# Altium integrated library Self made library.IntLib: 370 symbols (part 3 of 3) (continued)
## TLV70025
designator U?  Manufacturer Part Number 1: TLV70025DDCR
MANUFACTURER: Texas Instruments; MANUFACTURER_PART_NUMBER: TLV70025QDDCRQ1; UNIT_PRICE: 0.62; Description 1: Régulateurs de tension LDO 200mA Low IQ Low Dropout Reg; Tension d'entrée max.: 5.5 V; Nombre de sorties: 1 Output; Courant de sortie: 200 mA; Type de sortie: Fixed; Tension de sortie: 2.5 V; Package/Boîte: SOT-23-5; Conditionnement: Reel; Tension de décrochage maximale: 175 mV at 200 mA; Style de montage: SMD/SMT; Tolérance de la tension de sortie: 2 %; Régulation de la ligne: 1 mV; Température de fonctionnement max.: + 125 C; Dissipation de puissance max.: 500 mW; Température de fonctionnement min.: - 40 C; Catégorie du produit: Regulators - Low Dropout (LDO); Quantité standard du lot: 3000; SUPPLIER: Mouser; SUPPLIER_PART_NUMBER: 595-TLV70025QDDCRQ1; Supplier 1: Mouser; Supplier Part Number 1: 595-TLV70025DDCR; Manufacturer 1: Texas Instruments; RoHS: RoHS Compliant; Category: Régulateurs de tension LDO; Stock 1: 1832; Pricing 1: 1=0.532, 10=0.405, 100=0.213, 1000=0.191, 3000=0.163, 9000=0.151, 24000=0.145 (CHF); Série: TLV70025; Marque: Texas Instruments; Précision de la régulation de la tension: 2 %; Régulation de la charge: 1 mV; Fabricant: Texas Instruments; RoHS - Mouser: Y; Minimum Order Quantity: 1; Reeling: True; ComponentLink1URL: http://www.mouser.com/ds/2/405/tlv700-558265.pdf; ComponentLink1Description: http://www.mouser.com/ds/2/405/tlv700-558265.pdf
footprint SOT-23-5
pins: 1 VIN, 2 GND, 3 EN, 4 NC, 5 VOUT

## TLV70028
designator U?  Manufacturer Part Number 1: TLV70028DDCR
MANUFACTURER: Texas Instruments; MANUFACTURER_PART_NUMBER: TLV70025QDDCRQ1; UNIT_PRICE: 0.62; Description 1: Régulateurs de tension LDO 200mA Low IQ LDO Reg for Portables; Tension d'entrée max.: 5.5 V; Nombre de sorties: 1 Output; Courant de sortie: 200 mA; Type de sortie: Fixed; Tension de sortie: 2.8 V; Package/Boîte: SOT-23-5; Conditionnement: Reel; Tension de décrochage maximale: 175 mV at 200 mA; Style de montage: SMD/SMT; Tolérance de la tension de sortie: 2 %; Kit de développement: TLV70028EVM-463; Tension d'entrée MIN: + 2 V; Régulation de la ligne: 1 mV; Température de fonctionnement max.: + 125 C; Dissipation de puissance max.: 0.5 W; Température de fonctionnement min.: - 40 C; Catégorie du produit: Regulators - Low Dropout (LDO); Quantité standard du lot: 3000; SUPPLIER: Mouser; SUPPLIER_PART_NUMBER: 595-TLV70025QDDCRQ1; Supplier 1: Mouser; Supplier Part Number 1: 595-TLV70028DDCR; Manufacturer 1: Texas Instruments; RoHS: RoHS Compliant; Category: Régulateurs de tension LDO; Stock 1: 2338; Pricing 1: 1=0.532, 10=0.405, 100=0.213, 1000=0.191, 3000=0.163, 9000=0.151, 24000=0.145 (CHF); Série: TLV70028; Marque: Texas Instruments; Précision de la régulation de la tension: 2 %; Régulation de la charge: 1 mV; Fabricant: Texas Instruments; RoHS - Mouser: Y; Minimum Order Quantity: 1; Reeling: True; ComponentLink1URL: http://www.mouser.com/ds/2/405/tlv700-558265.pdf; ComponentLink1Description: http://www.mouser.com/ds/2/405/tlv700-558265.pdf
footprint SOT-23-5
pins: 1 VIN, 2 GND, 3 EN, 4 NC, 5 VOUT

## TP
designator ?, comment Test point
footprint TP
pins: P$1 1

## TPS2041SO
designator U?, comment Manufacturer Part Number 1: TPS2041BDBVR  (hidden comment: TPS2041B   CURRENT-LIMITED, POWER-DISTRIBUTION SWITCHES)
MANUFACTURER: Texas Instruments; UNIT_PRICE: 1.53; Description 1: CI commutateurs USB Sgl Ch Crnt-Ltd Pwr Dist Sw; Plage de températures de fonctionnement: - 40 C to + 85 C; Package/Boîte: SOT-23-5; Conditionnement: Reel; Style de montage: SMD/SMT; Température de fonctionnement max.: + 85 C; Température de fonctionnement min.: - 40 C; Nombre d'interrupteurs: Single; Catégorie du produit: Hot Swap and Power Distribution; Quantité standard du lot: 3000; Tension d’alimentation - Max.: 5.5 V; Tension d’alimentation - Min.: 2.7 V; MANUFACTURER_PART_NUMBER: TPS2041BDBVR; SUPPLIER: mouser; SUPPLIER_PART_NUMBER: 595-TPS2041BDBVR; Supplier 1: Mouser; Supplier Part Number 1: 595-TPS2041BDBVR; Manufacturer 1: Texas Instruments; RoHS: RoHS Compliant; Category: CI commutateurs USB; Stock 1: 8341; Pricing 1: 1=1.41, 10=1.13, 100=0.868, 500=0.671, 1000=0.605, 3000=0.537, 9000=0.520 (CHF); Série: TPS2041B; Marque: Texas Instruments; Fabricant: Texas Instruments; RoHS - Mouser: Y; Minimum Order Quantity: 1; Reeling: True; ComponentLink1URL: http://www.mouser.com/ds/2/405/tps2041b-407888.pdf; ComponentLink1Description: http://www.mouser.com/ds/2/405/tps2041b-407888.pdf
footprint R-PDSO-G5
pins: 1 OUT, 2 GND, 3 OC, 4 EN, 5 IN

## TPS53318
designator U?, comment Régulateurs de tension - Régulateurs de commutation Hi Eff 8A SD Reg  Manufacturer Part Number 1: TPS53318DQPR
MANUFACTURER: Texas Instruments; UNIT_PRICE: 6.6; Tension d'entrée: 1.5 V to 22 V; Tension d'entrée max.: 22 V; Nombre de sorties: 1 Output; Plage de températures de fonctionnement: - 40 C to + 85 C; Tension de sortie: 0.6 V to 5.5 V; Package/Boîte: LSON-CLIP-22; Conditionnement: Reel; Série: TPS53318; Style de montage: SMD/SMT; Fréquence de commutation: 250 kHz to 1 MHz; Topologie: Buck; Tension d'entrée MIN: 1.5 V; Température de fonctionnement max.: + 85 C; Température de fonctionnement min.: - 40 C; Catégorie du produit: Regulators - Non-Isolated Switching DC/DC; Quantité standard du lot: 2500; MANUFACTURER_PART_NUMBER: TPS53318DQPR; SUPPLIER: Mouser; SUPPLIER_PART_NUMBER: 595-TPS53318DQPR; Supplier 1: Mouser; Supplier Part Number 1: 595-TPS53318DQPR; Manufacturer 1: Texas Instruments; RoHS: RoHS Compliant; Description 1: Régulateurs de tension - Régulateurs de commutation Hi Eff 8A SD Reg; Category: Régulateurs de tension - Régulateurs de commutation; Stock 1: 9077; Pricing 1: 1=6.52, 10=5.86, 25=5.50, 50=5.34, 100=4.82, 250=4.43, 500=4.04, 750=3.73, 1000=3.36, 2500=3.36 (CHF); Courant de sortie: 8 A; Type: Voltage Converter; Marque: Texas Instruments; Fabricant: Texas Instruments; RoHS - Mouser: Y; Minimum Order Quantity: 1; Reeling: True; ComponentLink1URL: http://www.mouser.com/ds/2/405/tps53318-556625.pdf; ComponentLink1Description: http://www.mouser.com/ds/2/405/tps53318-556625.pdf
footprint R-PSON-N22
pins: 1 VFB, 2 EN, 3 PGOOD, 4 VBST, 5 ROVP, 6 LL, 7 LL@1, 8 LL@2, 9 LL@3, 10 LL@4, 11 LL@5, 12 VIN, 13 VIN@1, 14 VIN@2, 15 VIN@3, 16 VIN@4, 17 VIN@5, 18 VREG, 19 VDD, 20 MODE, 21 TRIP, 22 RF, GND

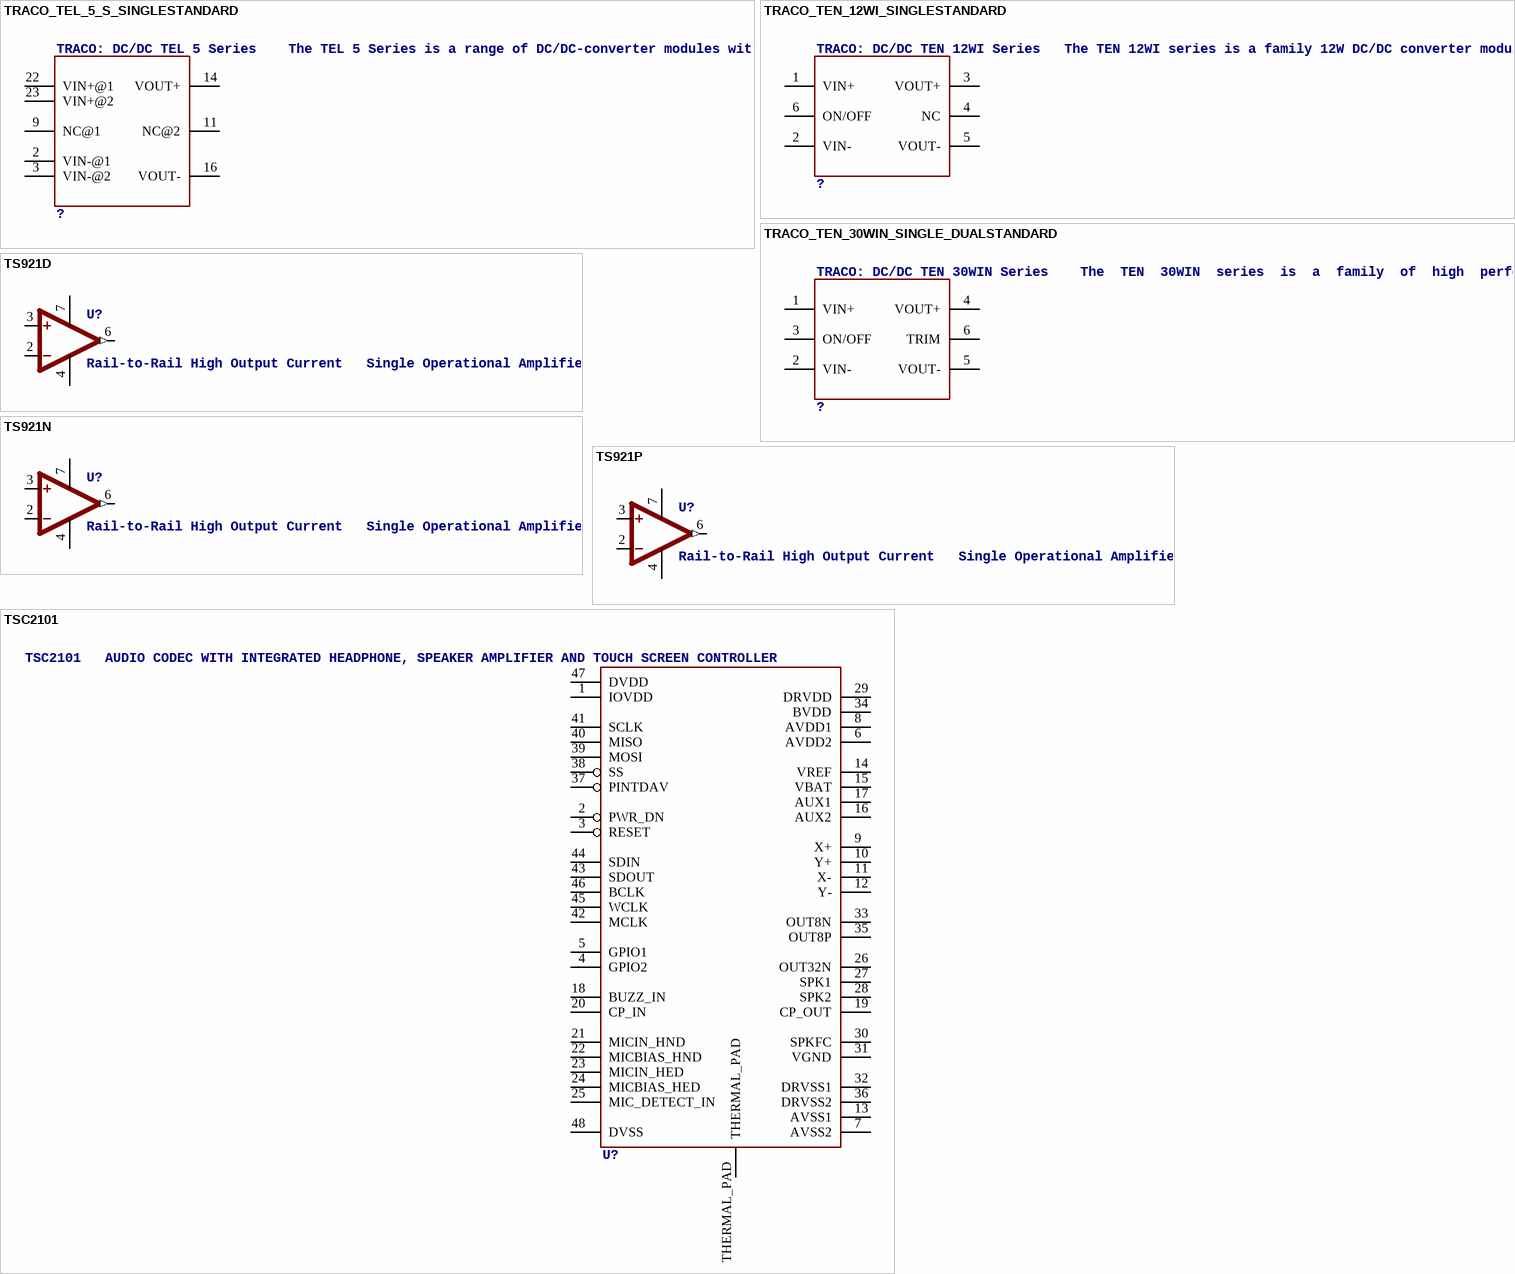
[diagram p18: symbols TRACO_TEL_5_S_SINGLESTANDARD to TSC2101]

## TRACO_TEL_5_S_SINGLESTANDARD
designator ?, comment TRACO: DC/DC TEL 5 Series    The TEL 5 Series is a range of DC/DC-converter modules with wide input range of 2:1. State of the art SMD-technology guarantees a product with very high reli- ability and excellent cost /performance ratio. High efficiency allows an operating temperature range of
footprint TEL_5_S
pins: 2 VIN-@1, 3 VIN-@2, 9 NC@1, 11 NC@2, 14 VOUT+, 16 VOUT-, 22 VIN+@1, 23 VIN+@2

## TRACO_TEN_12WI_SINGLESTANDARD
designator ?, comment TRACO: DC/DC TEN 12WI Series   The TEN 12WI series is a family 12W DC/DC converter modules.
footprint TEN12WI
pins: 1 VIN+, 2 VIN-, 3 VOUT+, 4 NC, 5 VOUT-, 6 ON/OFF

## TRACO_TEN_30WIN_SINGLE_DUALSTANDARD
designator ?, comment TRACO: DC/DC TEN 30WIN Series    The  TEN  30WIN  series  is  a  family  of  high  performance  30W  dc-dc  converter modules featuring ultra wide 4:1 input voltage ranges in a compact low profile case with industry-standard footprint. Standard features include remote On/Off, output voltage trimming, over voltage protection, under voltage lockout, over temperature and short circuit protection. Typical  applications  for  these  products  are  battery  operated  equipment  and distributed power architectures in communication and industrial electronics, every- where where isolated, tightly regulated voltages are required and space is limited on the PCB.
footprint TEN30WIN_SINGLE_DUAL
pins: 1 VIN+, 2 VIN-, 3 ON/OFF, 4 VOUT+, 5 VOUT-, 6 TRIM

## TS921D
designator U?, comment Rail-to-Rail High Output Current   Single Operational Amplifier
footprint SO-8
pins: 2 -IN, 3 +IN, 4 V- (power), 6 OUT (out), 7 V+ (power)

## TS921N
designator U?, comment Rail-to-Rail High Output Current   Single Operational Amplifier
footprint DIP8
pins: 2 -IN, 3 +IN, 4 V- (power), 6 OUT (out), 7 V+ (power)

## TS921P
designator U?, comment Rail-to-Rail High Output Current   Single Operational Amplifier
footprint TSSOP8
pins: 2 -IN, 3 +IN, 4 V- (power), 6 OUT (out), 7 V+ (power)

## TSC2101
designator U?, comment TSC2101   AUDIO CODEC WITH INTEGRATED HEADPHONE, SPEAKER AMPLIFIER AND TOUCH SCREEN CONTROLLER
MANUFACTURER: Texas Instruments; MANUFACTURER_PART_NUMBER: TSC2101IRGZ; UNIT_PRICE: 9.93; SUPPLIER: mouser; SUPPLIER_PART_NUMBER: 595-TSC2101IRGZ
footprint S-PVQFN-N48_LARGERPINS
pins: 1 IOVDD, 2 PWR_DN, 3 RESET, 4 GPIO2, 5 GPIO1, 6 AVDD2, 7 AVSS2, 8 AVDD1, 9 X+, 10 Y+, 11 X-, 12 Y-, 13 AVSS1, 14 VREF, 15 VBAT, 16 AUX2, 17 AUX1, 18 BUZZ_IN, 19 CP_OUT, 20 CP_IN, 21 MICIN_HND, 22 MICBIAS_HND, 23 MICIN_HED, 24 MICBIAS_HED, 25 MIC_DETECT_IN, 26 OUT32N, 27 SPK1, 28 SPK2, 29 DRVDD, 30 SPKFC, 31 VGND, 32 DRVSS1, 33 OUT8N, 34 BVDD, 35 OUT8P, 36 DRVSS2, 37 PINTDAV, 38 SS, 39 MOSI, 40 MISO, 41 SCLK, 42 MCLK, 43 SDOUT, 44 SDIN, 45 WCLK, 46 BCLK, 47 DVDD, 48 DVSS, THERMAL_PAD

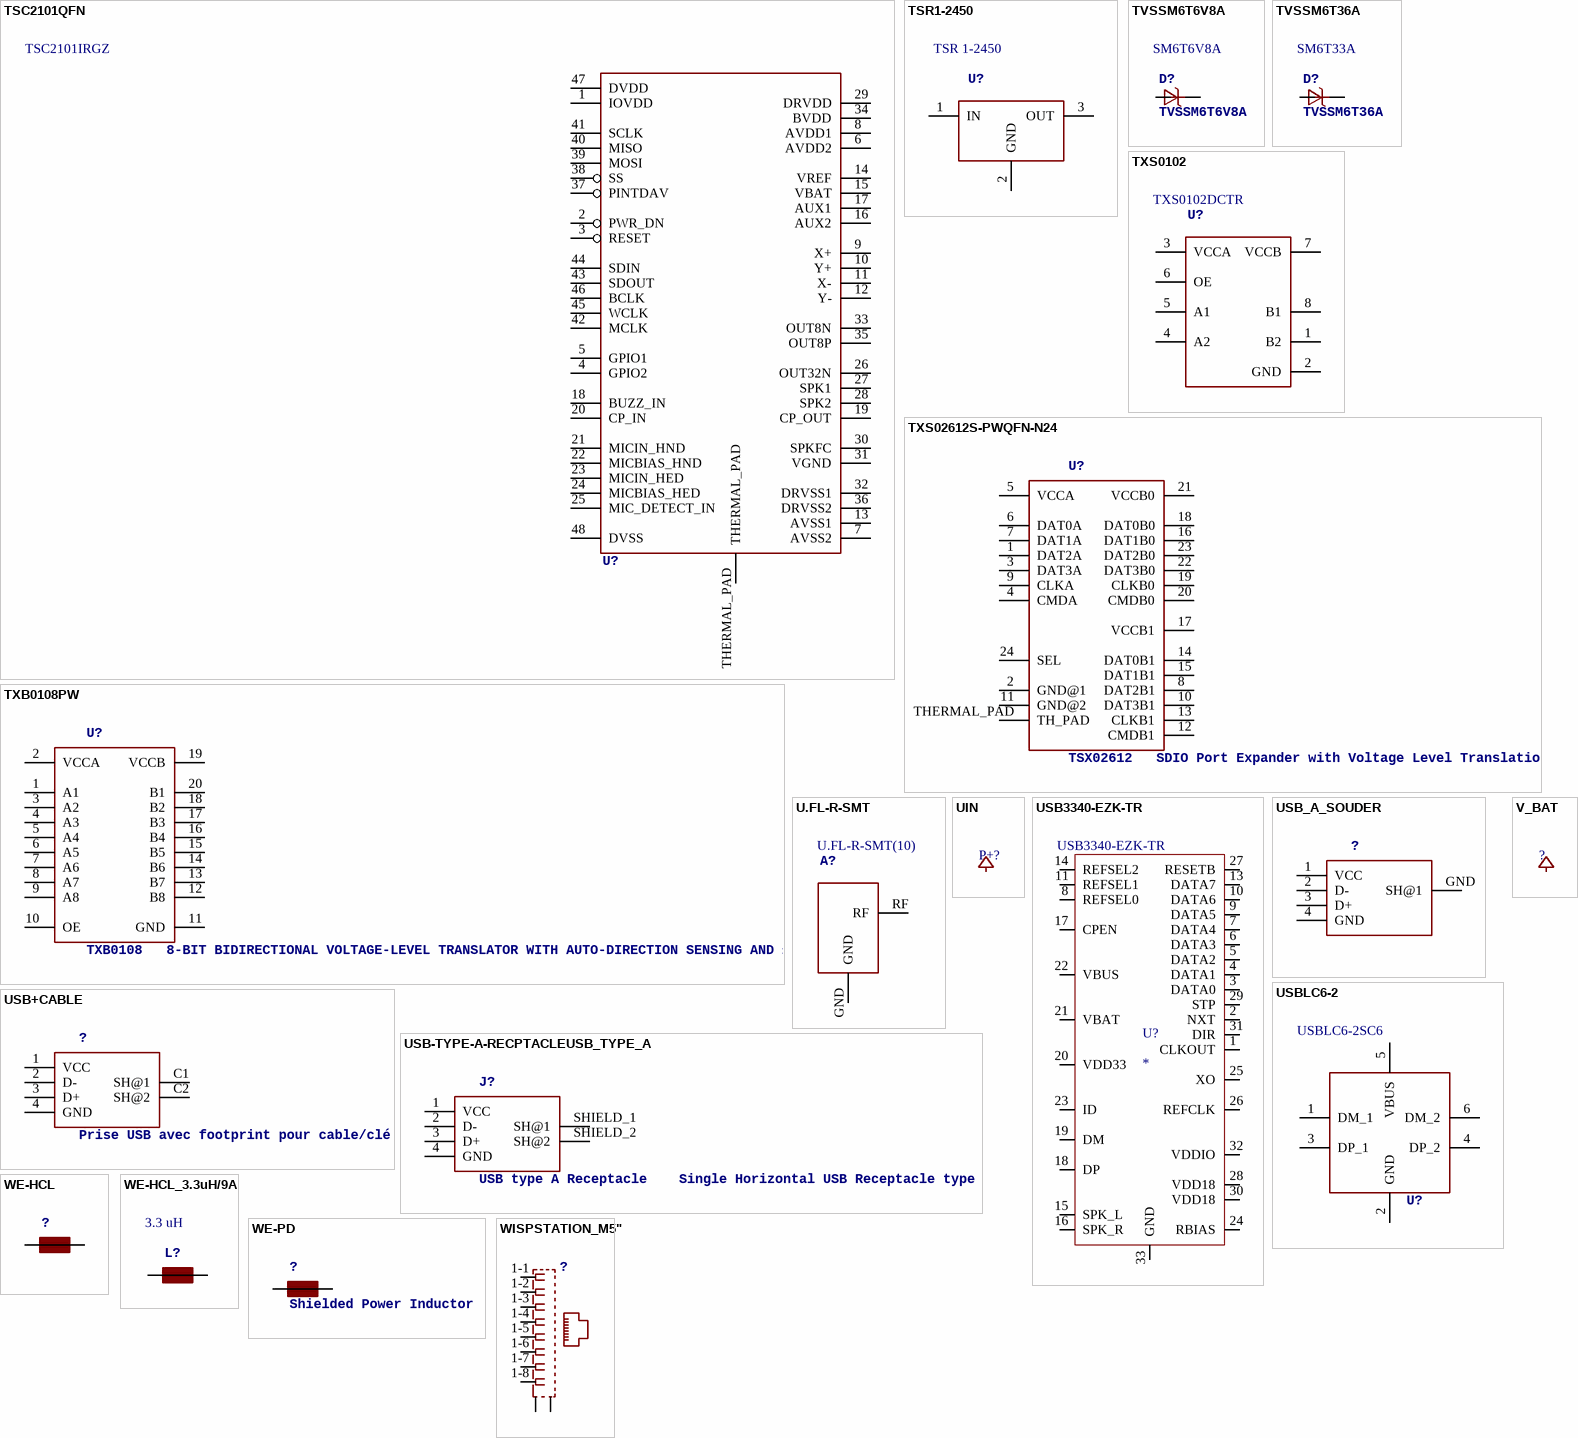
[diagram p19: symbols TSC2101QFN to WISPSTATION_M5"]

## TSC2101QFN
designator U?, comment Manufacturer Part Number 1: TSC2101IRGZ  (hidden comment: TSC2101   AUDIO CODEC WITH INTEGRATED HEADPHONE, SPEAKER AMPLIFIER AND TOUCH SCREEN CONTROLLER)
MANUFACTURER: Texas Instruments; UNIT_PRICE: 9.04; Description 1: Contrôleurs d'écran tactile Prog 4-Wire w/6 Audio Inputs; Débit de données: 125 kS/s, 48 kS/s; Type d'entrée: 1 TSC; Température de fonctionnement: - 40 C to + 85 C; Package/Boîte: VQFN-48; Conditionnement: Tube; Résolution: 8 bit, 10 bit, 12 bit; Alimentation en courant: 82 uA; Tension d'alimentation: 3 V to 3.6 V; Type d'interface: Serial, 3-Wire, 4-Wire, SPI; Style de montage: SMD/SMT; Kit de développement: TSC2101EVM; Température de fonctionnement max.: + 85 C; Température de fonctionnement min.: - 40 C; Nombre d'entrées de CAD: 5 Input; Nombre de sorties de CNA: 5 Output; Catégorie du produit: Touch Screen Controllers; Quantité standard du lot: 52; Tension d’alimentation - Max.: 3.6 V; Tension d’alimentation - Min.: 3 V; MANUFACTURER_PART_NUMBER: TSC2101IRGZ; SUPPLIER: DigiKey; SUPPLIER_PART_NUMBER: 296-17512-ND; Supplier 1: Mouser; Supplier Part Number 1: 595-TSC2101IRGZ; Manufacturer 1: Texas Instruments; RoHS: RoHS Compliant; Category: Contrôleurs d'écran tactile; Stock 1: 4; Pricing 1: 1=10.11, 10=9.09, 25=8.54, 50=8.28, 100=7.48, 250=6.87, 500=6.26, 750=5.78, 1000=5.22 (CHF); Série: TSC2101; Type: Resistive Audio CODEC, Headphone Amp; Marque: Texas Instruments; Fabricant: Texas Instruments; RoHS - Mouser: Y; Minimum Order Quantity: 1; Reeling: False; ComponentLink1URL: http://www.mouser.com/ds/2/405/tsc2101-452100.pdf; ComponentLink1Description: http://www.mouser.com/ds/2/405/tsc2101-452100.pdf
footprint S-PVQFN-N48
pins: 1 IOVDD, 2 PWR_DN, 3 RESET, 4 GPIO2, 5 GPIO1, 6 AVDD2, 7 AVSS2, 8 AVDD1, 9 X+, 10 Y+, 11 X-, 12 Y-, 13 AVSS1, 14 VREF, 15 VBAT, 16 AUX2, 17 AUX1, 18 BUZZ_IN, 19 CP_OUT, 20 CP_IN, 21 MICIN_HND, 22 MICBIAS_HND, 23 MICIN_HED, 24 MICBIAS_HED, 25 MIC_DETECT_IN, 26 OUT32N, 27 SPK1, 28 SPK2, 29 DRVDD, 30 SPKFC, 31 VGND, 32 DRVSS1, 33 OUT8N, 34 BVDD, 35 OUT8P, 36 DRVSS2, 37 PINTDAV, 38 SS, 39 MOSI, 40 MISO, 41 SCLK, 42 MCLK, 43 SDOUT, 44 SDIN, 45 WCLK, 46 BCLK, 47 DVDD, 48 DVSS, THERMAL_PAD

## TSR1-2450
designator U?, comment Manufacturer Part Number: TSR 1-2450  (hidden comment: DC/DC Converter)
Manufacturer: TRACO Power; Input Voltage: 6.5 V to 36 V; Number of Outputs: 1 Output; Output Type: Fixed; Package/Case Size: SIP-3; Output Current-Channel 1: 1 A; Output Voltage-Channel 1: 5 V; Product Status: New at Mouser; Digger CMP: CMP4455; Supplier 1: Mouser; RoHS: RoHS Compliant; Category: Non-Isolated DC/DC Converters; Stock 1: 1142; Pricing 1: 1=7.33, 10=6.59, 25=6.23, 50=5.86, 100=5.47, 250=5.26, 500=5.08, 1000=4.92, 2500=4.75 (CHF); Dimensions: 0.46 in  x 0.3 in  x 0.4 in; Height: 0.4 in; Length: 0.46 in; Operating Temperature Range: - 40 C to + 85 C; Packaging: Bulk; Product: Non-Isolated / POL; Series: TSR 1; Width: 0.3 in; Brand: TRACO Power; Mounting Style: Through Hole; RoHS - Mouser: Y; Minimum Order Quantity: 1; Reeling: False; ComponentLink1URL: http://www.mouser.com/ds/2/687/tsr1-537631.pdf; ComponentLink1Description: http://www.mouser.com/ds/2/687/tsr1-537631.pdf; Supplier Part Number 1: 495-TSR-1-2450
footprint TSR1-2450
pins: 1 IN, 2 GND, 3 OUT

## TVSSM6T6V8A
designator D?  Manufacturer Part Number: SM6T6V8A
Manufacturer: STMicroelectronics; Breakdown Voltage: 6.45 V to 7.14 V; Capacitance: 4000 pF; Clamping Voltage: 13.4 V; Operating Voltage: 5.8 V; Peak Surge Current: 298 A; Peak Pulse Power Dissipation: 600 W; Polarity: Unidirectional; Digger CMP: CMP3580; Supplier 1: Mouser; RoHS: RoHS Compliant; Category: TVS Diodes - Transient Voltage Suppressors; Stock 1: 15158; Pricing 1: 1=0.408, 10=0.274, 100=0.152, 1000=0.114, 2500=0.096, 10000=0.089, 25000=0.082, 50000=0.079 (CHF); Dimensions: 3.95 mm W x 4.6 mm L x 2.45 mm H; Package/Case: DO-214AA; Packaging: Reel; Series: SM6T6V8; Termination Style: SMD/SMT; Brand: STMicroelectronics; Mounting Style: SMD/SMT; Maximum Operating Temperature: + 150 C; Minimum Operating Temperature: - 55 C; Product Category: Voltage Protection Devices; Standard Pack Qty: 2500; Tradename: Transil; RoHS - Mouser: Y; Minimum Order Quantity: 1; Reeling: True; ComponentLink1URL: http://www.mouser.com/ds/2/389/CD00000725-310683.pdf; ComponentLink1Description: http://www.mouser.com/ds/2/389/CD00000725-310683.pdf; Supplier Part Number 1: 511-SM6T6V8A
footprint DIODE_UNIDIR_SMB
pins: A, C

## TVSSM6T36A
designator D?  Manufacturer Part Number: SM6T33A
Manufacturer: STMicroelectronics; Breakdown Voltage: 31.4 V to 34.7 V; Capacitance: 1000 pF; Clamping Voltage: 59 V; Operating Voltage: 28.2 V; Peak Surge Current: 68 A; Peak Pulse Power Dissipation: 600 W; Polarity: Unidirectional; Digger CMP: CMP4439; Supplier 1: Mouser; RoHS: RoHS Compliant; Category: TVS Diodes - Transient Voltage Suppressors; Stock 1: 17455; Pricing 1: 1=0.390, 10=0.258, 100=0.172, 1000=0.133, 2500=0.111, 10000=0.106, 25000=0.103 (CHF); Dimensions: 3.95 mm W x 4.6 mm L x 2.45 mm H; Package/Case: DO-214AA; Packaging: Reel; Series: SM6T33; Termination Style: SMD/SMT; Brand: STMicroelectronics; Mounting Style: SMD/SMT; Maximum Operating Temperature: + 150 C; Minimum Operating Temperature: - 55 C; Product Category: Voltage Protection Devices; Standard Pack Qty: 2500; Tradename: Transil; RoHS - Mouser: Y; Minimum Order Quantity: 1; Reeling: True; ComponentLink1URL: http://www.mouser.com/ds/2/389/CD00000725-310683.pdf; ComponentLink1Description: http://www.mouser.com/ds/2/389/CD00000725-310683.pdf; Supplier Part Number 1: 511-SM6T33A
footprint DIODE_UNIDIR_SMB
pins: A, C

## TXB0108PW
designator U?, comment TXB0108   8-BIT BIDIRECTIONAL VOLTAGE-LEVEL TRANSLATOR WITH AUTO-DIRECTION SENSING AND ±15-kV ESD PROTECTION
footprint TSSOP20
pins: 1 A1, 2 VCCA, 3 A2, 4 A3, 5 A4, 6 A5, 7 A6, 8 A7, 9 A8, 10 OE, 11 GND, 12 B8, 13 B7, 14 B6, 15 B5, 16 B4, 17 B3, 18 B2, 19 VCCB, 20 B1

## TXS0102
designator U?, comment Manufacturer Part Number 1: TXS0102DCTR  (hidden comment: 2-BIT BIDIRECTIONAL VOLTAGE-LEVEL TRANSLATOR FOR OPEN-DRAIN AND PUSH-PULL APPLICATIONS)
MANUFACTURER: Texas Instruments; UNIT_PRICE: 0.917; Description 1: Translation - Niveaux de tension 2B Bidirec Vltg- Level Translator; Package/Boîte: SSOP-8; Conditionnement: Reel; Série: TXS0102; Style de montage: SMD/SMT; Température de fonctionnement max.: + 85 C; Température de fonctionnement min.: - 40 C; Catégorie du produit: Logic - Voltage Level Translation; Délai de propagation: 260 ns; Quantité standard du lot: 3000; Tension d’alimentation - Max.: 3.6 V, 5.5 V; Tension d’alimentation - Min.: 1.65 V, 2.3 V; MANUFACTURER_PART_NUMBER: TXS0102DCTR; SUPPLIER: mouser; SUPPLIER_PART_NUMBER: 595-TXS0102DCTR; Supplier 1: Mouser; Supplier Part Number 1: 595-TXS0102DCTR; Manufacturer 1: Texas Instruments; RoHS: RoHS Compliant; Category: Translation - Niveaux de tension; Stock 1: 14561; Pricing 1: 1=1.02, 10=0.901, 25=0.813, 50=0.753, 100=0.711, 250=0.607, 500=0.536, 750=0.468, 1000=0.363, 3000=0.363 (CHF); Marque: Texas Instruments; Fabricant: Texas Instruments; RoHS - Mouser: Y; Minimum Order Quantity: 1; Reeling: True; ComponentLink1URL: http://www.mouser.com/ds/2/405/txs0102-407983.pdf; ComponentLink1Description: http://www.mouser.com/ds/2/405/txs0102-407983.pdf
footprint TXS0102DCTR
pins: 1 B2, 2 GND, 3 VCCA, 4 A2, 5 A1, 6 OE, 7 VCCB, 8 B1

## TXS02612S-PWQFN-N24
designator U?, comment TSX02612   SDIO Port Expander with Voltage Level Translation
footprint S-PWGFN-N24
pins: 1 DAT2A, 2 GND@1, 3 DAT3A, 4 CMDA, 5 VCCA, 6 DAT0A, 7 DAT1A, 8 DAT2B1, 9 CLKA, 10 DAT3B1, 11 GND@2, 12 CMDB1, 13 CLKB1, 14 DAT0B1, 15 DAT1B1, 16 DAT1B0, 17 VCCB1, 18 DAT0B0, 19 CLKB0, 20 CMDB0, 21 VCCB0, 22 DAT3B0, 23 DAT2B0, 24 SEL, THERMAL_PAD TH_PAD

## U.FL-R-SMT
designator A?  Manufacturer Part Number 1: U.FL-R-SMT(10)
MANUFACTURER: Samtec; MANUFACTURER_PART_NUMBER: MMCX-J-P-H-ST-TH1; Manufacturer 1: Hirose Connector; UNIT_PRICE: 2.33; Description 1: Connecteurs RF / Connecteurs coaxiaux U.FL RECEPTACLE SMT GLD M CONT REEL; Dépôt par contact: Gold; Sexe: Plug; Impédance: 50 Ohms; Plage de températures de fonctionnement: - 40 C to + 90 C; Conditionnement: Reel; Produit: Connectors; Série: U.FL; Style du raccordement: Solder; Matériau du contact: Brass; Finition du boîtier: Silver; Fabricant: Hirose Electric; Fréquence max.: 6 GHz; Catégorie du produit: Coaxial Connectors; Quantité standard du lot: 2500; SUPPLIER: Samtec; SUPPLIER_PART_NUMBER: MMCX-J-P-H-ST-TH1; Supplier 1: Mouser; Supplier Part Number 1: 798-U.FL-R-SMT10; RoHS: RoHS Compliant; Category: Connecteurs RF / Connecteurs coaxiaux; Stock 1: 42738; Pricing 1: 1=1.12, 10=0.896, 100=0.857, 250=0.779, 500=0.715, 1000=0.624, 2500=0.565, 5000=0.545, 10000=0.506 (CHF); Orientation: Vertical; Marque: Hirose Connector; Nom commercial: U.FL; RoHS - Mouser: Y; Minimum Order Quantity: 1; Reeling: True; ComponentLink1URL: http://www.hirose.co.jp/cataloge_hp/ed_UFL_20141014.pdf; ComponentLink1Description: http://www.hirose.co.jp/cataloge_hp/ed_UFL_20141014.pdf
footprint U.FL-R-SMT-1 (RF SMD receptacle coax U.FL)
pins: GND, RF

## UIN
designator P+?
pins: ?1 UIN (oe)

## USB3340-EZK-TR
designator U?  Manufacturer Part Number 1: USB3340-EZK-TR
Manufacturer 1: Microchip Technology; Description 1: Circuit intégré d'interface USB Hi-Speed USB 2.0 flexPWR ULPI Trans; Débit de données: 480 Mb/s; Package/Boîte: QFN-24; Conditionnement: Reel; Vitesse: High-Speed; Type d'interface: ULPI; Style de montage: SMD/SMT; Fabricant: Microchip; Température de fonctionnement max.: + 85 C; Température de fonctionnement min.: - 40 C; Courant d'alimentation de fonctionnement: 1.5 A; Tension d'alimentation de fonctionnement: 1.8 V to 3.3 V; Catégorie du produit: USB Transceivers; Quantité standard du lot: 4000; Supplier 1: Mouser; Supplier Part Number 1: 886-USB3340-EZK-TR; RoHS: RoHS Compliant; Category: Circuit intégré d'interface USB; Stock 1: 8599; Pricing 1: 1=1.79, 10=1.54, 25=1.28, 100=1.18, 5000=1.18 (CHF); Type: Transceiver; Marque: Microchip Technology; Standard: USB 2.0; RoHS - Mouser: Y; Minimum Order Quantity: 1; Reeling: True; ComponentLink1URL: http://www.smsc.com/Downloads/SMSC/Downloads_Public/Data_Sheets/334x.pdf; ComponentLink1Description: http://www.smsc.com/Downloads/SMSC/Downloads_Public/Data_Sheets/334x.pdf
footprint QFN32p5x5mm (QFN, 32-Leads, Body 5,00x3,00mm, Pitch 0,50mm, Thermal Pad 3,20x3,20mm, IPC Medium Density)
pins: 1 CLKOUT, 2 NXT, 3 DATA0, 4 DATA1, 5 DATA2, 6 DATA3, 7 DATA4, 8 REFSEL0, 9 DATA5, 10 DATA6, 11 REFSEL1, 13 DATA7, 14 REFSEL2, 15 SPK_L, 16 SPK_R, 17 CPEN, 18 DP, 19 DM, 20 VDD33, 21 VBAT, 22 VBUS, 23 ID, 24 RBIAS, 25 XO, 26 REFCLK, 27 RESETB, 28 VDD18, 29 STP, 30 VDD18, 31 DIR, 32 VDDIO, 33 GND

## USB+CABLE
designator ?, comment Prise USB avec footprint pour cable/clé
footprint WE_62900416021
pins: 1 VCC, 2 D-, 3 D+, 4 GND, C1 SH@1, C2 SH@2

## USB-TYPE-A-RECPTACLEUSB_TYPE_A
designator J?, comment USB type A Receptacle    Single Horizontal USB Receptacle type A
footprint USB_1
pins: 1 VCC, 2 D-, 3 D+, 4 GND, SHIELD_1 SH@1, SHIELD_2 SH@2

## USB_A_SOUDER
designator ?
footprint USB_SOLDER
pins: 1 VCC, 2 D-, 3 D+, 4 GND, GND SH@1

## USBLC6-2
designator U?, comment Manufacturer Part Number 1: USBLC6-2SC6  (hidden comment: Very low capacitance ESD protection)
MANUFACTURER: STMicroelectronics; UNIT_PRICE: 0.902; Description 1: Antistatique ESD Protection Low Cap; Tension de rupture: 6 V; Capacité électrique: 3.5 pF; Blocage de la tension: 17 V; Tension de fonctionnement: 5 V; Package/Boîte: SOT-23-6; Conditionnement: Reel; Série: USBLC6-2; Style du raccordement: SMD/SMT; Canaux: 2 Channel; Catégorie du produit: Voltage Protection Devices; Quantité standard du lot: 3000; MANUFACTURER_PART_NUMBER: USBLC6-2SC6; SUPPLIER: mouser; SUPPLIER_PART_NUMBER: 511-USBLC6-2SC6; Supplier 1: Mouser; Supplier Part Number 1: 511-USBLC6-2SC6; Manufacturer 1: STMicroelectronics; RoHS: RoHS Compliant; Category: Antistatique; Stock 1: 18430; Pricing 1: 1=0.532, 10=0.357, 100=0.200, 1000=0.149, 3000=0.125, 9000=0.117, 24000=0.107, 99000=0.104 (CHF); Marque: STMicroelectronics; Fabricant: STMicroelectronics; RoHS - Mouser: Y; Minimum Order Quantity: 1; Reeling: True; ComponentLink1URL: http://www.mouser.com/ds/2/389/CD00050750-251785.pdf; ComponentLink1Description: http://www.mouser.com/ds/2/389/CD00050750-251785.pdf
footprint SOT23-6L
pins: 1 DM_1, 2 GND, 3 DP_1, 4 DP_2, 5 VBUS, 6 DM_2

## V_BAT
designator ?
pins: ?1 V_BAT (oe)

## WE-HCL
designator ?
footprint WE-HCL
pins: 1, 2

## WE-HCL_3.3uH/9A
designator L?  Bobinage: 3.3 uH  (hidden comment: WE-HCL_3.3uH/9A)
Manufacturer 1: Wurth Electronics; Manufacturer Part Number 1: 744314330; Description 1: Inducteurs fixes WE-HCI Flat 7050 3.3uH 9A 9mOhm; Matériau intérieur: Superflux; Courant CC max.: 9 A; Résistance CC max.: 9 mOhms; Plage de températures de fonctionnement: - 40 C to + 150 C; Package/Boîte: 7050; Conditionnement: Reel; Produit: Inductors; Fréquence de résonance propre: 65 MHz; Série: WE-HCI; Protection: Shielded; Style du raccordement: SMD/SMT; Tolérance: 20 %; Type: SMD Flat Wire High Current Inductor; Hauteur du boîtier: 4.8 mm; Longueur du boîtier: 7 mm; Largeur du boîtier: 6.9 mm; Quantité standard du lot: 1000; Fréquence de test: 100 kHz; Product Status: New Technology; Supplier 1: Mouser; Supplier Part Number 1: 710-744314330; RoHS: RoHS Compliant; Category: Inducteurs fixes; Stock 1: 2420; Pricing 1: 1=4.25, 10=4.10, 25=3.78, 50=3.62, 100=3.38, 250=2.99, 1000=2.99 (CHF); Marque: Wurth Electronics; Fabricant: Wurth Electronics; RoHS - Mouser: Y; Minimum Order Quantity: 1; Reeling: True; ComponentLink1URL: http://www.mouser.com/ds/2/445/744314330-539478.pdf; ComponentLink1Description: http://www.mouser.com/ds/2/445/744314330-539478.pdf
footprint WE-HCL-7050
pins: 1, 2

## WE-PD
designator ?, comment Shielded Power Inductor
MANUFACTURER: Wurth Electronics; MANUFACTURER_PART_NUMBER: 7447786008; UNIT_PRICE: 2.93; SUPPLIER: mouser; SUPPLIER_PART_NUMBER: 710-7447786008
footprint WE-PD
pins: 1, 2

## WISPSTATION_M5"
designator ?
footprint WISPSTATION_M5
pins: 1-1 1, 1-2 2, 1-3 3, 1-4 4, 1-5 5, 1-6 6, 1-7 7, 1-8 8, G1 S1, G2 S2

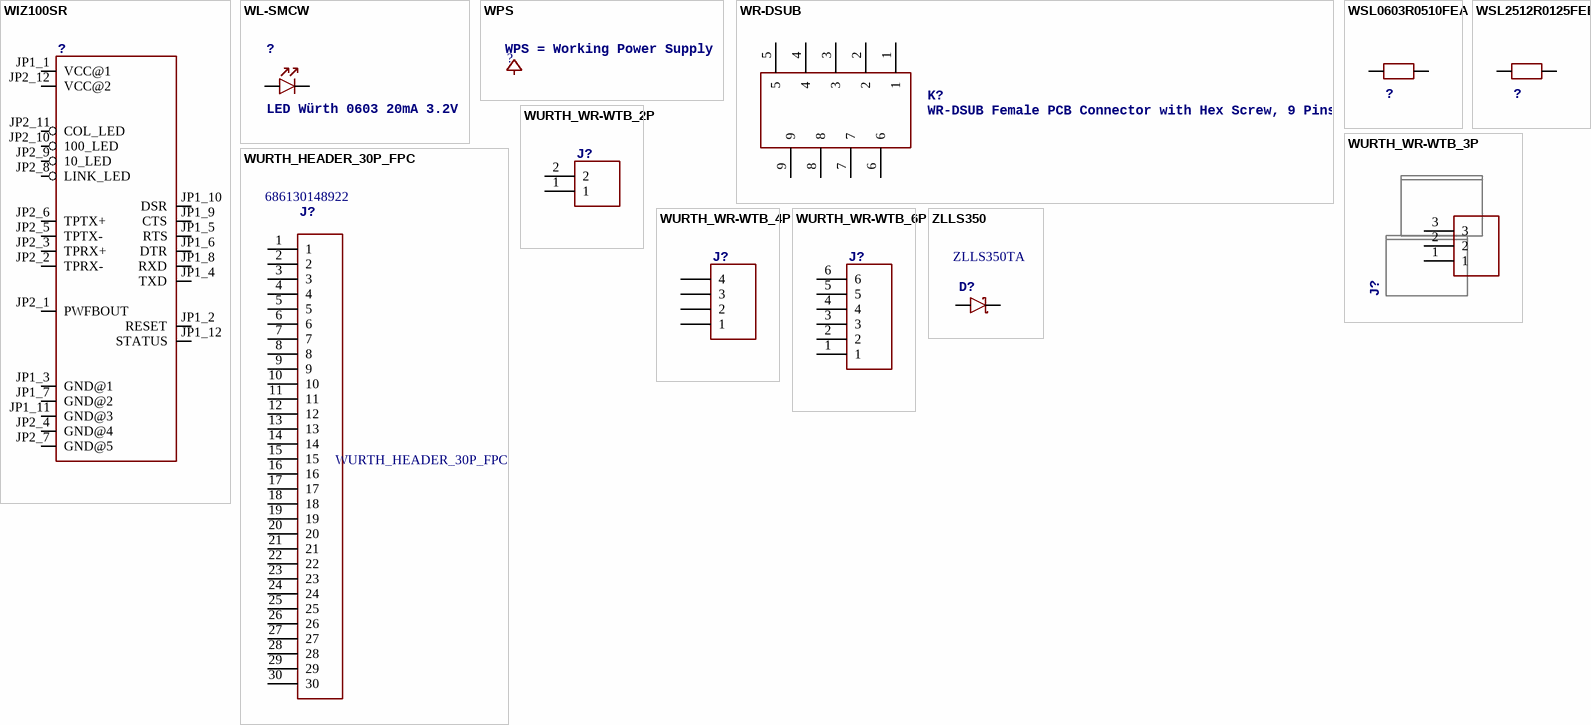
[diagram p20: symbols WIZ100SR to ZLLS350]

## WIZ100SR
designator ?
footprint WIZ100SR
pins: JP1_1 VCC@1, JP1_2 RESET, JP1_3 GND@1, JP1_4 TXD, JP1_5 RTS, JP1_6 DTR, JP1_7 GND@2, JP1_8 RXD, JP1_9 CTS, JP1_10 DSR, JP1_11 GND@3, JP1_12 STATUS, JP2_1 PWFBOUT, JP2_2 TPRX-, JP2_3 TPRX+, JP2_4 GND@4, JP2_5 TPTX-, JP2_6 TPTX+, JP2_7 GND@5, JP2_8 LINK_LED, JP2_9 10_LED, JP2_10 100_LED, JP2_11 COL_LED, JP2_12 VCC@2

## WL-SMCW
designator ?, comment LED Würth 0603 20mA 3.2V
MANUFACTURER: Würth Elektronik; MANUFACTURER_PART_NUMBER: 150060GS75000; UNIT_PRICE: 0.1; COLOR: green; SUPPLIER: Würth Elektronik; SUPPLIER_PART_NUMBER: 150060GS75000
footprint WL-SMCW
pins: A, C

## WPS
designator ?, comment WPS = Working Power Supply
pins: ?1 WPS (oe)

## WR-DSUB
designator K?, comment WR-DSUB Female PCB Connector with Hex Screw, 9 Pins
MANUFACTURER: Würth Elektronik; MANUFACTURER_PART_NUMBER: 618 009 293 21; UNIT_PRICE: 0; SUPPLIER: Würth Elektronik; SUPPLIER_PART_NUMBER: 618 009 293 21
footprint 61800929321
pins: 1, 2, 3, 4, 5, 6, 7, 8, 9

## WSL0603R0510FEA
designator ?
footprint R0603
pins: 1, 2

## WSL2512R0125FEB
designator ?
footprint R2512
pins: 1, 2

## WURTH_HEADER_30P_FPC
designator J?  Manufacturer Part Number 1: 686130148922
Manufacturer 1: Wurth Electronics; Description 1: Connecteurs FFC et FPC WR-FPC SMT Horiztl 1mm Bott Cont 30P; Conditionnement: Reel; Série: WR-FPC; Product Status: New Product; Supplier 1: Mouser; Supplier Part Number 1: 710-686130148922; RoHS: RoHS Compliant; Category: Connecteurs FFC et FPC; Stock 1: 0; Pricing 1: 1=2.36, 50=2.22, 100=2.06, 500=1.89, 1000=1.66, 2000=1.49 (CHF); Marque: Wurth Electronics; Fabricant: Wurth Electronics; RoHS - Mouser: Y; Minimum Order Quantity: 1; Reeling: True; ComponentLink1URL: http://www.mouser.com/ds/2/445/6861xx148922-469282.pdf; ComponentLink1Description: http://www.mouser.com/ds/2/445/6861xx148922-469282.pdf
footprint WURTH_HEADER_30P_FPC
pins: 1, 2, 3, 4, 5, 6, 7, 8, 9, 10, 11, 12, 13, 14, 15, 16, 17, 18, 19, 20, 21, 22, 23, 24, 25, 26, 27, 28, 29, 30

## WURTH_WR-WTB_2P
designator J?
footprint WURTH_WR-WTB_3.96MM_2P
pins: 1, 2

## WURTH_WR-WTB_3P
designator J?
footprint WURTH_WR-WTB_3.96MM_3P
pins: 1, 2, 3

## WURTH_WR-WTB_4P
designator J?
footprint WURTH_WR-WTB_3.96MM_4P
pins: 1, 2, 3, 4

## WURTH_WR-WTB_6P
designator J?
footprint WURTH_WR-WTB_3.96MM_6P
pins: 1, 2, 3, 4, 5, 6

## ZLLS350
designator D?  Manufacturer Part Number: ZLLS350TA  (hidden comment: ZLLS350)
Manufacturer: Diodes Incorporated; Configuration: Single; If - Forward Current: 0.65 A; Ifsm - Forward Surge Current: 6 A; Ir - Reverse Current: 4 uA at 30 V; Pd - Power Dissipation: 357 mW; trr - Reverse Recovery time: 1 ns; Vf - Forward Voltage: 1 V at 0.275 A; Vrrm - Repetitive Reverse Voltage: 40 V; Supplier 1: Mouser; RoHS: RoHS Compliant; Category: Schottky Diodes & Rectifiers; Stock 1: 13240; Pricing 1: 1=0.459, 10=0.341, 100=0.214, 1000=0.166, 3000=0.138, 9000=0.129, 24000=0.121, 45000=0.119, 99000=0.118 (CHF); Package/Case: SOD-523; Packaging: Reel; Product: Schottky Diodes; Series: ZLLS350; Technology: Si; Brand: Diodes Incorporated; Mounting Style: SMD/SMT; Maximum Operating Temperature: + 150 C; Minimum Operating Temperature: - 55 C; Product Category: Diodes - Schottky; Standard Pack Qty: 3000; RoHS - Mouser: Y; Minimum Order Quantity: 1; Reeling: True; ComponentLink1URL: http://www.mouser.com/ds/2/115/ZLLS350-93352.pdf; ComponentLink1Description: http://www.mouser.com/ds/2/115/ZLLS350-93352.pdf; Supplier Part Number 1: 522-ZLLS350TA
footprint SOD523
pins: A, C